# Altium footprint library SecurityBoard.PcbLib: 36 footprints (part 1 of 3)
Each footprint in its own frame and in the unit in brackets; x right, y up, seen from the top. Pads: shape width x height; smd on the part's side, far side on the other; paste and mask are expansions set on the pad; w line width, h text height; cw(c..) or ccw(c..) is an arc to the next point about the centre after c.
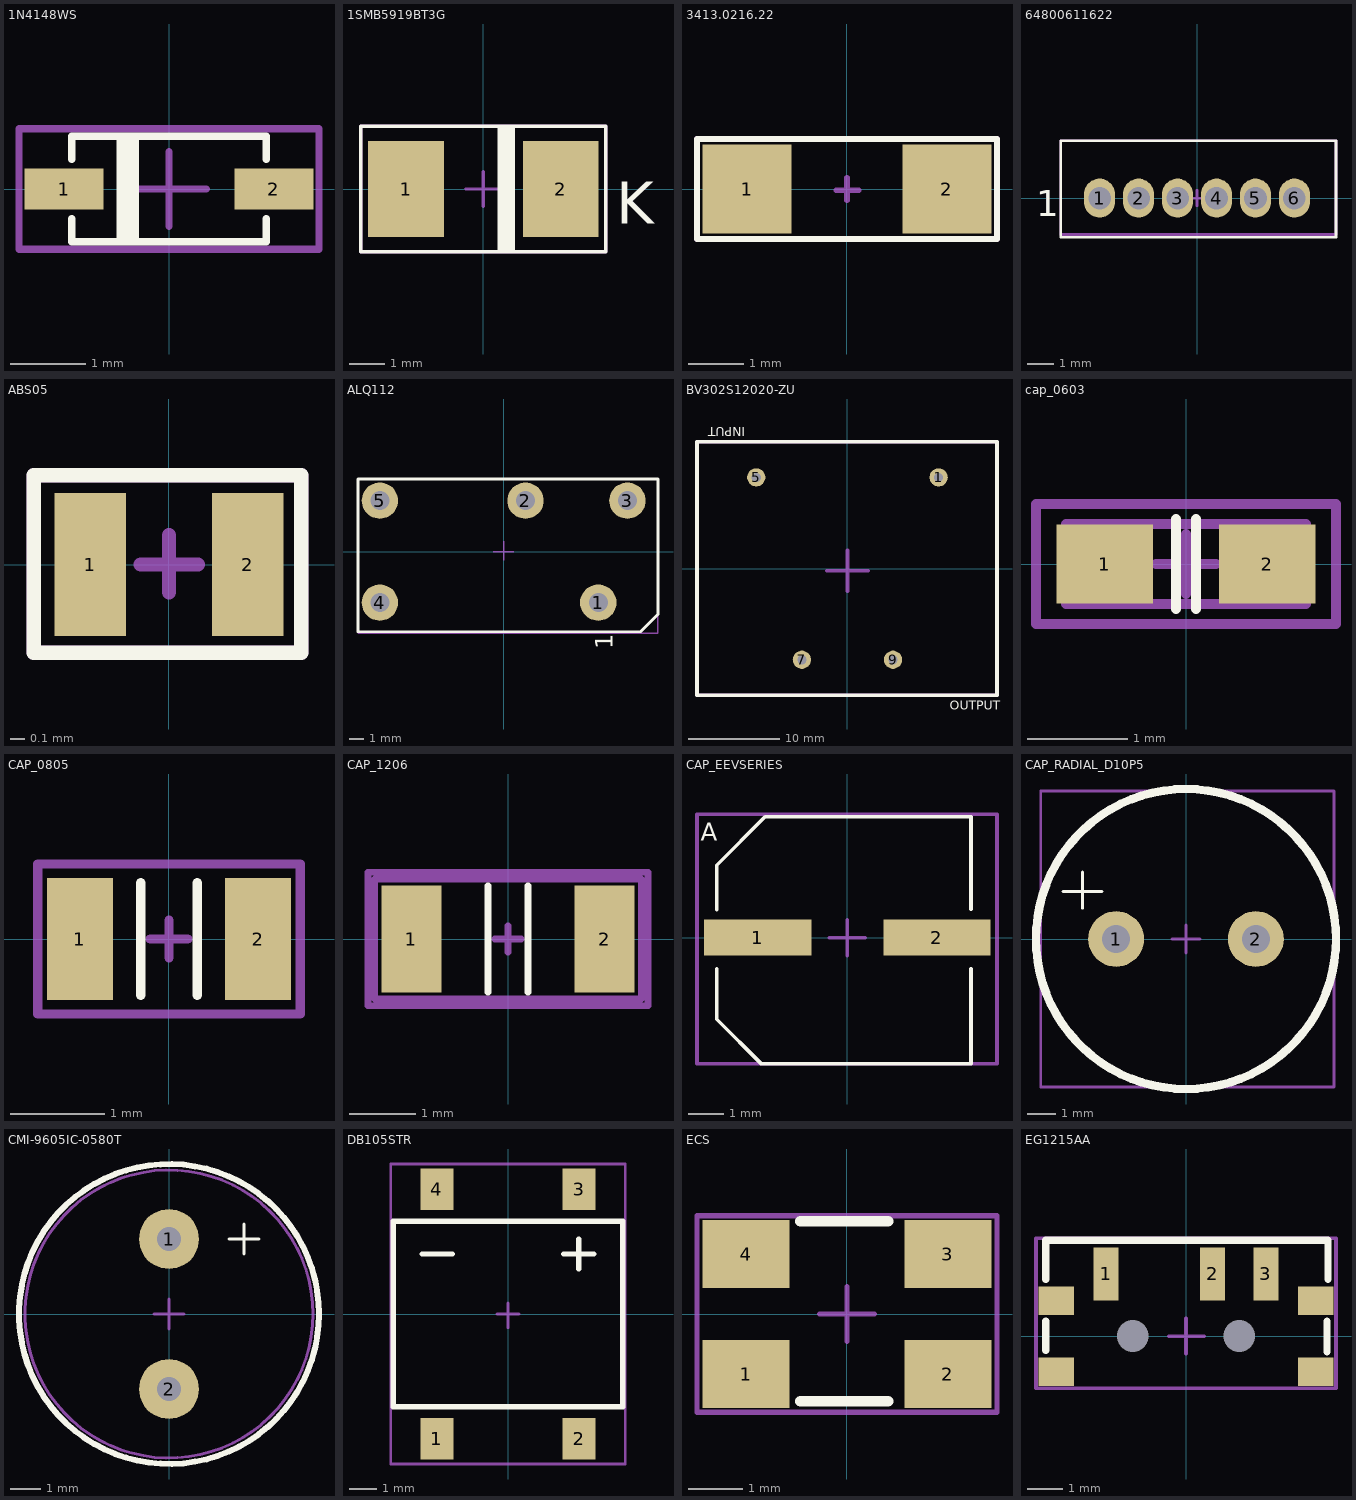
[diagram p0: the footprints below, top view; thin cyan lines are the x and y axes]

## 1N4148WS [mm]
pads (2):
  rect 1.05x0.55 smd paste+0 mask+0.05: 1(-1.4,0) 2(1.4,0)
Top Overlay:
  rectangle: -0.7,-0.7 -0.4,0.7
  lines w0.1: -1.3,-0.4 -1.3,-0.7 1.3,-0.7 1.3,-0.4 ; -1.3,0.4 -1.3,0.7 1.3,0.7 1.3,0.4
Top Component Center:
  lines w0.1: -0.5,0 0.5,0 ; 0,-0.5 0,0.5 ; -2,-0.8 -2,0.8 2,0.8 2,-0.8 -2,-0.8
Top Designator:
  lines w0.1: -2,-0.8 -2,0.8 2,0.8 2,-0.8 -2,-0.8
  text "'.Designator'" at -1.7,-0.5 h0.5
3D body "SOD323F-1.step": height 1, standoff 0, extent -1.25,-0.675 1.25,0.675

## 1SMB5919BT3G [mm]
pads (2):
  rect 2.159x2.743 smd: 1(-2.21,0) 2(2.21,0)
Top Overlay:
  rectangle: 0.4,-1.8 0.9,1.8
  lines w0.1: -3.51,-1.8 3.49,-1.8 3.49,1.8 -3.51,1.8 -3.51,-1.8
  text "K" at 3.79,-1 h1.2
Top Component Center:
  lines w0.1: -0.5,0 0.5,0 ; 0,-0.5 0,0.5 ; -3.51,-1.8 3.49,-1.8 3.49,1.8 -3.51,1.8 -3.51,-1.8
Top Designator:
  lines w0.1: -3.51,-1.8 3.49,-1.8 3.49,1.8 -3.51,1.8 -3.51,-1.8
  text "'.Designator'" at -3.31,-1.2 h1.2
3D body "403A-03_rotated.STEP": height 2.31, standoff 0, extent -2.63,-1.78 2.81,1.78

## 3413.0216.22 [mm]
pads (2):
  rect 1.6x1.6 smd mask+0.05: 1(-1.8,0) 2(1.8,0)
Top Overlay:
  lines w0.1: -2.7,-0.9 2.7,-0.9 2.7,0.9 -2.7,0.9 -2.7,-0.9
Top Component Center:
  lines w0.1: -0.192,-0.02 0.208,-0.02 ; 0,-0.2 0,0.2 ; -2.7,-0.9 2.7,-0.9 2.7,0.9 -2.7,0.9 -2.7,-0.9
Top Designator:
  lines w0.1: -2.7,-0.9 2.7,-0.9 2.7,0.9 -2.7,0.9 -2.7,-0.9
  text "'.Designator'" at -2.5,-0.6 h0.5
3D body "e_0100.3479_003.step": height 0.66, standoff 0.01, extent -1.612,-0.8 1.612,0.8

## 64800611622 [mm]
pads (6):
  oval 1.2x1.5 hole 0.87 paste+0 mask+0.05: 1(-3.75,0) 2(-2.25,0) 3(-0.75,0) 4(0.75,0) 5(2.25,0) 6(3.75,0)
Top Overlay:
  lines w0.1: -5.25,-1.5 5.35,-1.5 5.35,2.2 -5.25,2.2 -5.25,-1.5
  text "1" at -6.2,-0.7 h1
Top Component Center:
  lines w0.1: -0.3,0 0.3,0 ; 0,-0.3 0,0.3 ; -5.25,-1.4 -5.25,2.2 5.35,2.2 5.35,-1.4 -5.25,-1.4
Top Designator:
  lines w0.1: -5.25,-1.4 -5.25,2.2 5.35,2.2 5.35,-1.4 -5.25,-1.4
  text "'.Designator'" at -4.6,-0.7 h1
3D body "64800611622 (rev1).stp": height 4.51, standoff -2.69, extent -5.2,-1.35 5.3,2.15

## ABS05 [mm]
pads (2):
  rect 0.5x1 smd paste+0 mask+0.05: 1(-0.55,0) 2(0.55,0)
Top Overlay:
  lines w0.1: -0.948,0.619 -0.948,-0.617 0.925,-0.617 0.925,0.625 -0.948,0.625
Top Component Center:
  lines w0.1: -0.948,0.619 -0.948,-0.617 0.925,-0.617 0.925,0.625 -0.948,0.625 ; -0.197,0 0.203,0 ; 0,-0.194 0,0.206
Top Designator:
  lines w0.1: -0.948,0.619 -0.948,-0.617 0.925,-0.617 0.925,0.625 -0.948,0.625
  text "'.Designator'" at -0.8,-0.4 h0.4
3D body "ABS05.STEP": height 0.52, standoff 0.01, extent -0.8,-0.5 0.8,0.5

## ALQ112 [mm]
pads (5):
  round 2.5 hole 1.3: 1(6.5,-3.5) 2(1.5,3.5) 3(8.5,3.5) 4(-8.5,-3.5) 5(-8.5,3.5)
Top Overlay:
  lines w0.2: -10,-5.5 -10,5 10.6,5 10.6,-4.3 9.4,-5.5 -10,-5.5
  text "1" at 7.5,-6.7 h1.2
Top Component Center:
  lines w0.1: -0.7,0 0.7,0 ; 0,-0.6 0,-0.275 0,0.375 0,0.7 ; -10,-5.6 -10,5 10.6,5 10.6,-5.6 -10,-5.6
Top Designator:
  lines w0.1: -10,-5.6 -10,5 10.6,5 10.6,-5.6 -10,-5.6
  text "'.Designator'" at -6.4,-1.1 h1.2
3D body: height 15.6, standoff 0.4, extent -9.8,-5.2 10.2,4.8

## BV302S12020-ZU [mm]
pads (4):
  round 2 hole 1 mask+0.05: 1(10,10) 5(-10,10) 7(-5,-10) 9(5,-10)
Top Overlay:
  lines w0.4: -16.5,-13.9 16.4,-13.9 16.4,13.9 -16.5,13.9 -16.5,-13.9
  text "OUTPUT" at 11.2,-15.5 h1
  text "INPUT" at -11.2,15.5 h1
Top Component Center:
  lines w0.4: -2.25,-0.25 2.25,-0.25 ; 0,-2.5 0,2 ; -16.5,-13.9 16.4,-13.9 16.4,13.9 -16.5,13.9 -16.5,-13.9
Top Designator:
  lines w0.4: -16.5,-13.9 16.4,-13.9 16.4,13.9 -16.5,13.9 -16.5,-13.9
  text "'.Designator'" at -14.5,-5 h5
3D body "BV EI 302 2902.step": height 20.81, standoff -5.49, extent -16.25,-13.75 16.25,13.75

## cap_0603 [mil]
pads (2):
  rect 38x31 smd: 1(-32,0) 2(32,0)
Top Overlay:
  lines w3.94: -3.94,-17.72 -3.94,17.72 ; 3.94,-17.72 3.94,17.72
Top 3D Body:
  lines w3.94: -47.24,-15.75 47.24,-15.75 47.24,15.75 -39.37,15.75 -47.24,15.75 -47.24,7.87 -47.24,-15.75
Top Component Center:
  lines w3.94: -11.81,0 0,0 11.81,0 ; 0,-11.81 0,11.81 ; -59.06,-23.62 -59.06,23.62 59.06,23.62 59.06,-23.62 -59.06,-23.62
Top Designator:
  lines w3.94: -59.06,-23.62 -59.06,23.62 59.06,23.62 59.06,-23.62 -59.06,-23.62
  text "'.Designator'" at -55.12,-15.75 h15.75
3D body "cc.step": height 31.69, standoff 0, extent -48.43,-15.75 48.43,15.75

## CAP_0805 [mm]
pads (2):
  rect 0.7x1.3 smd mask+0.05: 1(-0.95,0) 2(0.95,0)
Top Overlay:
  lines w0.1: -0.3,-0.6 -0.3,0.6 ; 0.3,-0.6 0.3,0.6
Top Component Center:
  lines w0.1: -0.2,0 0.2,0 ; 0,-0.2 0,0.2 ; -1.4,-0.8 -1.4,0.8 1.4,0.8 1.4,-0.8 -1.4,-0.8
Top Designator:
  lines w0.1: -1.4,-0.8 -1.4,0.8 1.4,0.8 1.4,-0.8 -1.4,-0.8
  text "'.Designator'" at -1.3,-0.5 h0.5
3D body "C0805.STEP": height 0.8, standoff 0, extent -1.4,-0.625 1.4,0.625

## CAP_1206 [mm]
pads (2):
  rect 0.9x1.6 smd paste+0 mask+0.05: 1(-1.45,0) 2(1.45,0)
Top Overlay:
  lines w0.1: -0.3,-0.8 -0.3,0.8 ; 0.3,-0.8 0.3,0.8
Top Component Center:
  lines w0.1: -0.2,0 0.2,0 ; 0,-0.2 0,0.2 ; -2,-0.9 -2,0.9 2,0.9 2,-0.9 -2,-0.9
Top Designator:
  lines w0.1: -2.1,-1 -2.1,1 2.1,1 2.1,-1 -2.1,-1
  text "'.Designator'" at -1.8,-0.5 h0.5
3D body "CAP1206.step": height 1.67, standoff 0.01, extent -1.6,-0.785 1.6,0.775

## CAP_EEVSERIES [mm]
pads (2):
  rect 3x1 smd: 1(-2.5,0) 2(2.5,0)
Top Overlay:
  lines w0.1: -3.65,-0.875 -3.65,-2.275 -2.4,-3.525 3.45,-3.525 3.45,-0.875 ; -3.65,0.775 -3.65,2.025 -2.3,3.375 3.45,3.375 3.45,0.8
  text "A" at -4.1,2.7 h0.5
Top Component Center:
  lines w0.1: -0.5,0 0.5,0 ; 0,-0.5 0,0.5 ; -4.2,-3.525 4.175,-3.525 4.175,3.45 -4.2,3.45 -4.2,-3.525
Top Designator:
  lines w0.1: -4.2,-3.525 4.175,-3.525 4.175,3.45 -4.2,3.45 -4.2,-3.525
3D body "EEV686M035A9HAA.step": height 8.02, standoff 0.01, extent -3.775,-3.425 3.825,3.375

## CAP_RADIAL_D10P5 [mm]
pads (2):
  round 2 hole 1 mask+0.05: 1(-2.5,0) 2(2.5,0)
Top Overlay:
  circle w0.3: c0,0 r5.367
  lines w0.1: -4.4,1.7 -3,1.7 ; -3.7,1.1 -3.7,2.4
Top Component Center:
  lines w0.1: -0.5,0 0.5,0 ; 0,-0.5 0,0.5 ; -5.2,-5.3 5.3,-5.3 5.3,5.3 -5.2,5.3 -5.2,-5.3
Top Designator:
  lines w0.1: -5.2,-5.3 5.3,-5.3 5.3,5.3 -5.2,5.3 -5.2,-5.3
  text "'.Designator'" at 0.9,-4.3 h1
3D body "ESH477M050AH4AA.step": height 22.12, standoff -19.89, extent -5.25,-5.15 5.25,5.35

## CMI-9605IC-0580T [mm]
pads (2):
  round 2 hole 0.8: 1(0,2.5) 2(0,-2.5)
Top Overlay:
  circle w0.2: c0,0 r5
  lines w0.1: 2,2.5 3,2.5 ; 2.5,2 2.5,3
Top Component Center:
  circle w0.1: c0,0 r4.8
  lines w0.1: -0.5,0 0.5,0 ; 0,-0.5 0,0.5
Top Designator:
  circle w0.1: c0,0 r4.8
  text "'.Designator'" at -4,-1 h1.2
3D body: height 5.1, standoff 0.1, extent -4.8,-4.797 4.8,4.797
3D body: height 0.15, standoff -5.35, extent -0.298,2.201 0.3,2.799
3D body: height 1.65, standoff -3.85, extent -0.3,-2.8 0.298,-2.201
3D body: height 5.2, standoff 5.15, extent -4,-3.997 4,3.997

## DB105STR [mm]
pads (4):
  rect 1.2x1.52 smd mask+0.05: 1(-2.605,-4.57) 2(2.605,-4.57) 3(2.605,4.57) 4(-2.605,4.57)
Top Overlay:
  lines w0.2: -3.15,2.2 -2.05,2.2 ; 2.05,2.2 3.15,2.2 ; 2.6,1.65 2.6,2.75 ; -4.2,-3.4 -4.2,3.4 4.2,3.4 4.2,-3.4 -4.2,-3.4
Top Component Center:
  lines w0.1: -0.4,0 0.4,0 ; 0,-0.5 0,0.4 ; -4.3,-5.5 -4.3,5.5 4.3,5.5 4.3,-5.5 -4.3,-5.5
Top Designator:
  lines w0.1: -4.3,-5.5 4.3,-5.5 4.3,5.5 -4.3,5.5 -4.3,-5.5
  text "'.Designator'1" at 1,-3.2 h1.2
3D body "DB107S  DB-S.sldprt": height 2.67, standoff 0.01, extent -4.16,-5.2 4.16,5.2

## ECS [mm]
pads (4):
  rect 1.6x1.25 smd paste+0 mask+0.05: 1(-1.85,-1.1) 2(1.85,-1.1) 3(1.85,1.1) 4(-1.85,1.1)
Top Overlay:
  lines w0.2: -0.85,-1.6 0.75,-1.6 ; -0.85,1.7 0.75,1.7
Top Component Center:
  lines w0.1: -0.5,0 0.5,0 ; 0,-0.5 0,0.5 ; -2.75,-1.8 -2.75,1.8 2.75,1.8 2.75,-1.8 -2.75,-1.8
Top Designator:
  lines w0.1: -2.75,-1.8 -2.75,1.8 2.75,1.8 2.75,-1.8 -2.75,-1.8
  text "'.Designator'" at -2.625,-0.925 h1
3D body "ECS-160-20-30B-TR (1).STEP": height 0.86, standoff 0.01, extent -2.45,-1.6 2.55,1.6

## EG1215AA [mm]
pads (9):
  rect 0.7x1.5 smd mask+0.05: 1(-2.25,1.75) 2(0.75,1.75) 3(2.25,1.75)
  rect 1x0.8 smd mask+0.05: ""(-3.655,-1.007) ""(-3.65,1) ""(3.65,-1) ""(3.65,1)
  round 0 hole 0.9 mask+0.05: ""(-1.5,0) ""(1.5,0)
Top Overlay:
  lines w0.1: 3.975,2.7 4,2.7
  lines w0.2: -3.95,-0.4 -3.95,0.425 ; -3.95,1.6 -3.95,2.7 3.975,2.7 ; 3.975,-0.45 3.975,0.425 ; 4,1.6 4,2.7
Top Component Center:
  lines w0.1: -0.489,-0.01 0.511,-0.01 ; 0,-0.5 0,0.5 0,0 ; -4.225,-1.475 -4.225,2.75 4.225,2.75 4.225,-1.475 -4.225,-1.475
Top Designator:
  lines w0.1: -4.225,-1.475 -4.225,2.75 4.225,2.75 4.225,-1.475 -4.225,-1.475
  text "'.Designator'" at -3.1,-1 h1
3D body "EG1215AA--3DModel-STEP-1.STEP": height 1.41, standoff -0.29, extent -3.85,-2.7 3.85,2.2